# Altium footprint library TSC Footprints.PcbLib: 99 footprints (part 2 of 7)
Each footprint in its own frame and in the unit in brackets; x right, y up, seen from the top. Pads: shape width x height; smd on the part's side, far side on the other; paste and mask are expansions set on the pad; w line width, h text height; cw(c..) or ccw(c..) is an arc to the next point about the centre after c.
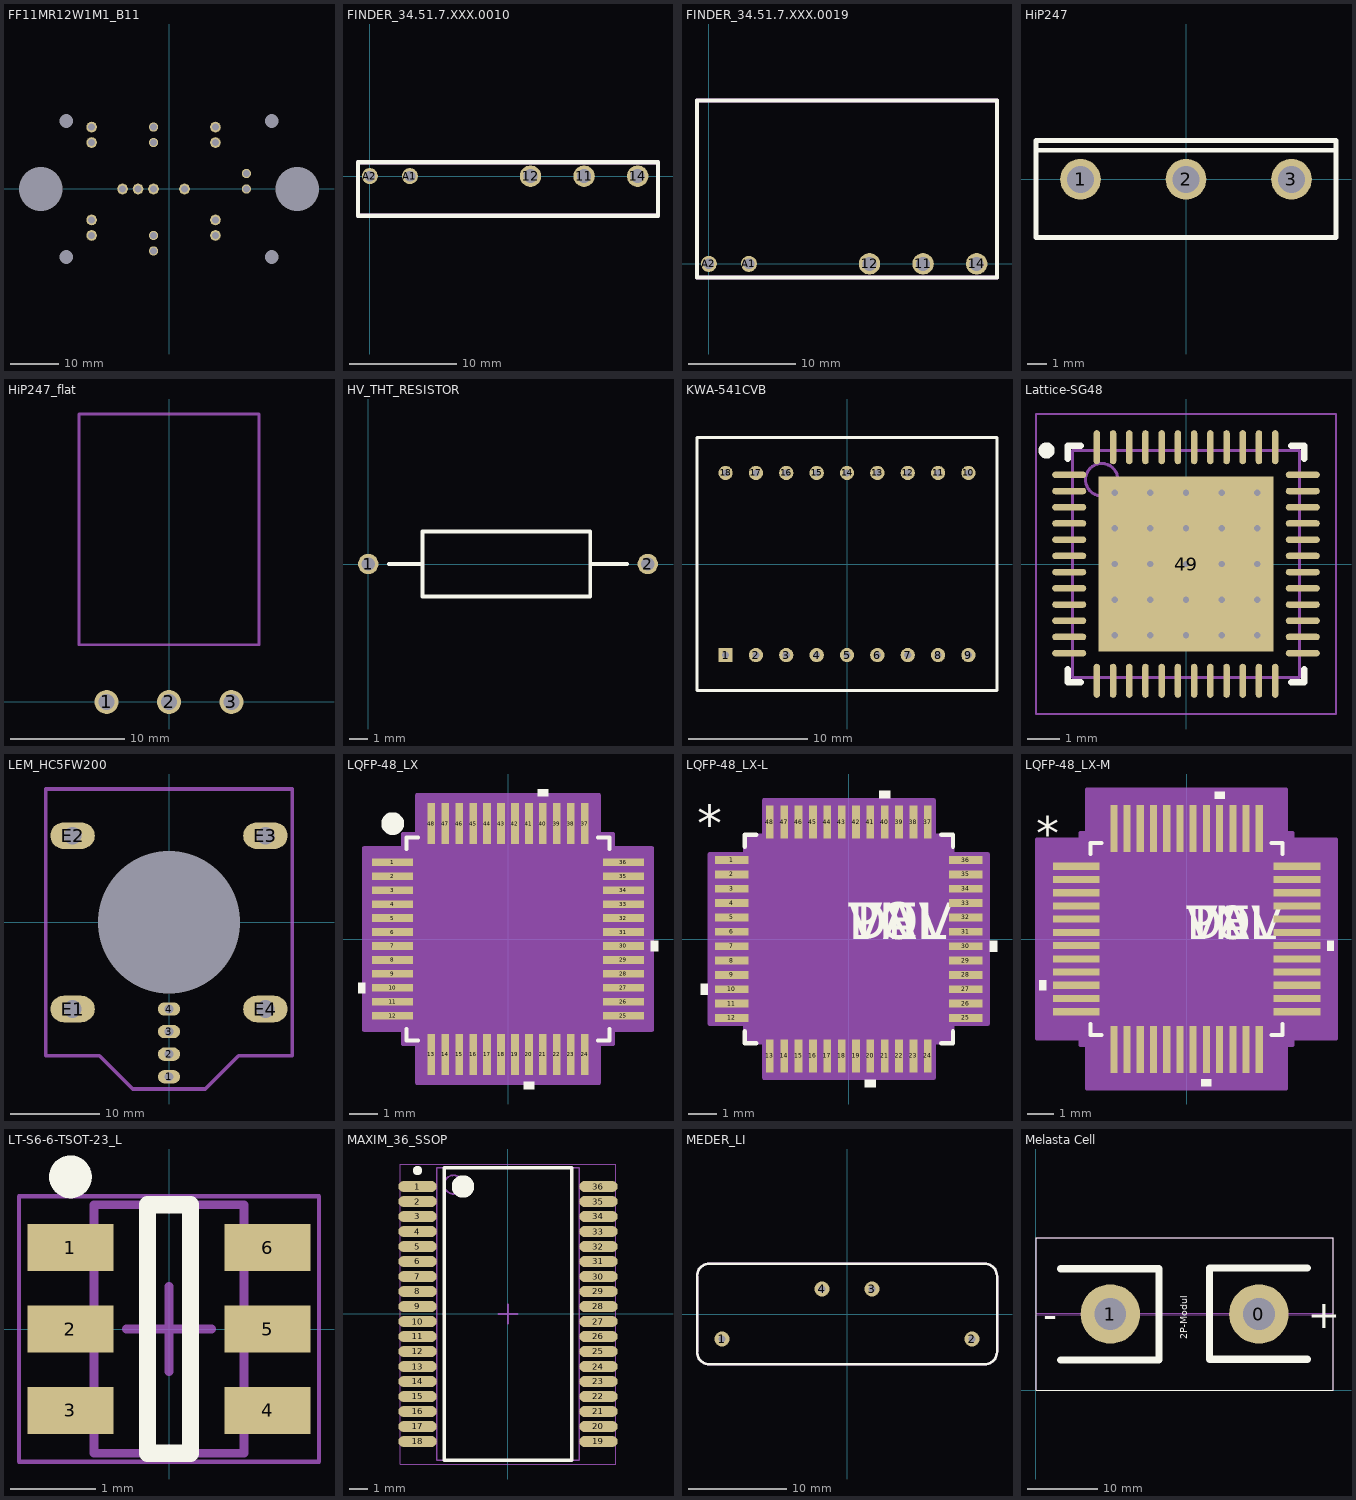
[diagram p1: the footprints below, top view; thin cyan lines are the x and y axes]

## FF11MR12W1M1_B11 [mm] "Infineon EasyDUAL package for FF11MR12W1M1_B11"
height 12
pads (24):
  round 2.2 hole 1.5 unplated: DC+(-16,-9.6) DC+(-16,-6.4) DC+(9.6,-9.6) DC+(9.6,-6.4) DC-(-9.6,0) DC-(-6.4,0) DC-(-3.2,0) DC-(3.2,0) PHASE(-16,9.6) PHASE(-16,12.8) PHASE(9.6,9.6) PHASE(9.6,12.8)
  round 1.9 hole 1.5 unplated: G_HS(-3.2,-9.6) G_LS(-3.2,9.6) NTC_1(16,3.2) NTC_2(16,0) S_HS(-3.2,-12.8) S_LS(-3.2,12.8)
  round 0 hole 9 unplated: ""(-26.5,0) ""(26.5,0)
  round 0 hole 2.8 unplated: ""(-21.25,-14.05) ""(-21.25,14.05) ""(21.25,-14.05) ""(21.25,14.05)
3D body "EasyDUAL.stp": height 12, standoff 0, extent -30.777,-16.9 30.777,16.9

## FINDER_34.51.7.XXX.0010 [mm]
height 5
pads (5):
  round 2 hole 1.3: 11(20,0) 12(15,0) 14(25,0)
  round 1.5 hole 1: A1(3.75,0) A2(0,0)
Top Overlay:
  lines w0.4: -1.1,-3.7 26.9,-3.7 26.9,1.3 -1.1,1.3 -1.1,-3.7
Mechanical 1:
  lines w0.4: -1.1,-3.7 -1.1,1.3 26.9,1.3 26.9,-3.7 -1.1,-3.7
3D body "3451.stp": height 15.01, standoff -3.49, extent -1.144,-3.81 26.856,1.19

## FINDER_34.51.7.XXX.0019 [mm]
height 5
pads (5):
  round 2 hole 1.3: 11(20,0) 12(15,0) 14(25,0)
  round 1.5 hole 1: A1(3.75,0) A2(0,0)
Top Overlay:
  lines w0.4: -1.1,-1.27 26.9,-1.27 26.9,15.24 -1.1,15.24 -1.1,-1.27
Mechanical 1:
  lines w0.4: -1.1,-1.27 -1.1,15.24 26.9,15.24 26.9,-1.27 -1.1,-1.27
3D body "3451x019.stp": height 5, standoff -2.5, extent -1.1,-0.2 26.9,15.4

## HiP247 [mm]
height 25
pads (3):
  round 2.1 hole 1.4: 1(-5.45,0) 2(0,0) 3(5.45,0)
Top Overlay:
  lines w0.254: -7.75,1.5 7.75,1.5 ; 7.75,-3 -7.75,-3 -7.75,2 7.75,2 7.75,-2.921
3D body "TO-247.STEP": height 24.2, standoff -14.8, extent -7.75,-3 7.75,2

## HiP247_flat [mm]
height 5.15
pads (3):
  round 2.1 hole 1.4: 1(-5.45,0) 2(0,0) 3(5.45,0)
Mechanical 1:
  lines w0.254: -7.875,5 7.875,5 7.875,25.15 -7.875,25.15 -7.875,5
3D body "TO-247H.STEP": height 5.4, standoff -7.5, extent -7.75,-0.25 7.75,25.15

## HV_THT_RESISTOR [mm]
height 3
pads (2):
  round 1.1 hole 0.7: 1(0,0) 2(15,0)
Top Overlay:
  lines w0.2: 1.1,0 2.912,0 2.912,1.75 11.913,1.75 11.913,-1.75 2.912,-1.75 2.912,0.025 ; 11.946,0 13.9,0
3D body: height 3.5, standoff 0, extent 2.946,-1.75 11.946,1.75

## KWA-541CVB [mm] "common cathode dual digit alphanumeric display"
height 7.7
pads (18):
  rect 1.2x1.2 hole 0.6: 1(-10.16,-7.62)
  round 1.2 hole 0.6: 2(-7.62,-7.62) 3(-5.08,-7.62) 4(-2.54,-7.62) 5(0,-7.62) 6(2.54,-7.62) 7(5.08,-7.62) 8(7.62,-7.62) 9(10.16,-7.62) 10(10.16,7.62) 11(7.62,7.62) 12(5.08,7.62) 13(2.54,7.62) 14(0,7.62) 15(-2.54,7.62) 16(-5.08,7.62) 17(-7.62,7.62) 18(-10.16,7.62)
Top Overlay:
  lines w0.254: -12.55,-10.575 12.55,-10.575 12.55,10.575 -12.55,10.575 -12.55,-10.575
3D body: height 7.7, standoff 0, extent -12.677,-10.702 12.677,10.702

## Lattice-SG48 [mm] "QFN, 48-Leads, Body 7,00x7,00mm, Pitch 0,50mm, Thermal Pad 4,40x4,40mm, IPC Low Density"
height 1
pads (49):
  oval 1.05x0.2 smd: 1(-3.6,2.75) 2(-3.6,2.25) 3(-3.6,1.75) 4(-3.6,1.25) 5(-3.6,0.75) 6(-3.6,0.25) 7(-3.6,-0.25) 8(-3.6,-0.75) 9(-3.6,-1.25) 10(-3.6,-1.75) 11(-3.6,-2.25) 12(-3.6,-2.75) 25(3.6,-2.75) 26(3.6,-2.25) 27(3.6,-1.75) 28(3.6,-1.25) 29(3.6,-0.75) 30(3.6,-0.25) 31(3.6,0.25) 32(3.6,0.75) 33(3.6,1.25) 34(3.6,1.75) 35(3.6,2.25) 36(3.6,2.75)
  oval 0.2x1.05 smd: 13(-2.75,-3.6) 14(-2.25,-3.6) 15(-1.75,-3.6) 16(-1.25,-3.6) 17(-0.75,-3.6) 18(-0.25,-3.6) 19(0.25,-3.6) 20(0.75,-3.6) 21(1.25,-3.6) 22(1.75,-3.6) 23(2.25,-3.6) 24(2.75,-3.6) 37(2.75,3.6) 38(2.25,3.6) 39(1.75,3.6) 40(1.25,3.6) 41(0.75,3.6) 42(0.25,3.6) 43(-0.25,3.6) 44(-0.75,3.6) 45(-1.25,3.6) 46(-1.75,3.6) 47(-2.25,3.6) 48(-2.75,3.6)
  rect 5.4x5.4 smd: 49(0,0)
via -2.2,2.2 diameter 0.5 hole 0.2
via -1.1,2.2 diameter 0.5 hole 0.2
via 0,2.2 diameter 0.5 hole 0.2
via 1.1,2.2 diameter 0.5 hole 0.2
via 2.2,2.2 diameter 0.5 hole 0.2
via -2.2,1.1 diameter 0.5 hole 0.2
via -1.1,1.1 diameter 0.5 hole 0.2
via 0,1.1 diameter 0.5 hole 0.2
via 1.1,1.1 diameter 0.5 hole 0.2
via 2.2,1.1 diameter 0.5 hole 0.2
via -2.2,0 diameter 0.5 hole 0.2
via -1.1,0 diameter 0.5 hole 0.2
via 0,0 diameter 0.5 hole 0.2
via 1.1,0 diameter 0.5 hole 0.2
via 2.2,0 diameter 0.5 hole 0.2
via -2.2,-1.1 diameter 0.5 hole 0.2
via -1.1,-1.1 diameter 0.5 hole 0.2
via 0,-1.1 diameter 0.5 hole 0.2
via 1.1,-1.1 diameter 0.5 hole 0.2
via 2.2,-1.1 diameter 0.5 hole 0.2
via -2.2,-2.2 diameter 0.5 hole 0.2
via -1.1,-2.2 diameter 0.5 hole 0.2
via 0,-2.2 diameter 0.5 hole 0.2
via 1.1,-2.2 diameter 0.5 hole 0.2
via 2.2,-2.2 diameter 0.5 hole 0.2
Top Overlay:
  circle w0.25: c-4.3,3.5 r0.125
  lines w0.2: -3.65,-3.25 -3.65,-3.65 -3.25,-3.65 ; -3.65,3.25 -3.65,3.65 -3.25,3.65 ; 3.25,-3.65 3.65,-3.65 3.65,-3.25 ; 3.25,3.65 3.65,3.65 3.65,3.25
Mechanical 13:
  circle w0.1: c-2.6,2.6 r0.5
  lines w0.1: -3.5,-3.5 -3.5,3.5 3.5,3.5 3.5,-3.5 -3.5,-3.5
Mechanical 15:
  lines w0.05: -4.625,-4.625 -4.625,4.625 4.625,4.625 4.625,-4.625 -4.625,-4.625
  lines w0.1: -0.5,0 0.5,0 ; 0,-0.5 0,0.5
3D body "Lattice-SG48.step": height 1, standoff 0, extent -3.501,-3.501 3.501,3.501

## LEM_HC5FW200 [mm]
height 12
pads (9):
  oval 2.5x1.5 hole 1: 1(0,-17.37) 2(0,-14.83) 3(0,-12.29) 4(0,-9.75)
  oval 5x3 hole 2: E1(-10.85,-9.75) E2(-10.85,9.75) E3(10.85,9.75) E4(10.85,-9.75)
  round 0 hole 16 unplated: ""(0,0)
Mechanical 1:
  lines w0.4: -13.85,-15 -13.85,15 13.85,15 13.85,-15 7.825,-15 4.075,-18.75 -4.075,-18.75 -7.825,-15 -13.85,-15
3D body: height 12, standoff 0, extent -13.85,-18.75 13.85,15

## LQFP-48_LX [mm]
pads (48):
  rect 1.461x0.27 smd: 1(-4.125,2.75) 2(-4.125,2.25) 3(-4.125,1.75) 4(-4.125,1.25) 5(-4.125,0.75) 6(-4.125,0.25) 7(-4.125,-0.25) 8(-4.125,-0.75) 9(-4.125,-1.25) 10(-4.125,-1.75) 11(-4.125,-2.25) 12(-4.125,-2.75) 25(4.125,-2.75) 26(4.125,-2.25) 27(4.125,-1.75) 28(4.125,-1.25) 29(4.125,-0.75) 30(4.125,-0.25) 31(4.125,0.25) 32(4.125,0.75) 33(4.125,1.25) 34(4.125,1.75) 35(4.125,2.25) 36(4.125,2.75)
  rect 0.27x1.461 smd: 13(-2.75,-4.125) 14(-2.25,-4.125) 15(-1.75,-4.125) 16(-1.25,-4.125) 17(-0.75,-4.125) 18(-0.25,-4.125) 19(0.25,-4.125) 20(0.75,-4.125) 21(1.25,-4.125) 22(1.75,-4.125) 23(2.25,-4.125) 24(2.75,-4.125) 37(2.75,4.125) 38(2.25,4.125) 39(1.75,4.125) 40(1.25,4.125) 41(0.75,4.125) 42(0.25,4.125) 43(-0.25,4.125) 44(-0.75,4.125) 45(-1.25,4.125) 46(-1.75,4.125) 47(-2.25,4.125) 48(-2.75,4.125)
Top Overlay:
  circle w0.5: c-4.125,4.125 r0.157
  region: -5.11,-1.559 -5.364,-1.559 -5.364,-1.94 -5.11,-1.94
  region: 0.941,-5.11 0.56,-5.11 0.56,-5.364 0.941,-5.364
  region: 5.11,-0.059 5.364,-0.059 5.364,-0.44 5.11,-0.44
  region: 1.441,5.11 1.06,5.11 1.06,5.364 1.441,5.364
  lines w0.152: -3.627,-3.218 -3.627,-3.627 -3.218,-3.627 ; -3.627,3.218 -3.627,3.627 -3.218,3.627 ; 3.218,-3.627 3.627,-3.627 3.627,-3.218 ; 3.218,3.627 3.627,3.627 3.627,3.218
Mechanical 13:
  text "*" at -3.119,3 h1.27
Mechanical 15:
  region: -3.258,-3.754 -3.754,-3.754 -3.754,-3.258 -5.143,-3.258 -5.143,3.258 -3.754,3.258 -3.754,3.754 -3.258,3.754 -3.258,5.143 3.258,5.143 3.258,3.754 3.754,3.754 3.754,3.258 5.143,3.258 5.143,-3.258 3.754,-3.258 3.754,-3.754 3.258,-3.754 3.258,-5.143 -3.258,-5.143
  lines w0.152: -5.143,-3.258 -3.754,-3.258 -3.754,-3.754 -3.258,-3.754 -3.258,-5.143 3.258,-5.143 3.258,-3.754 3.754,-3.754 3.754,-3.258 5.143,-3.258 5.143,3.258 3.754,3.258 3.754,3.754 3.258,3.754 3.258,5.143 -3.258,5.143 -3.258,3.754 -3.754,3.754 -3.754,3.258 -5.143,3.258 -5.143,-3.258
3D body: height 0.25, standoff 0, extent 0,0 0.254,0.254
3D body "LQFP-48_LX.step": height 1.6, standoff 0, extent -4.5,-4.5 4.5,4.5

## LQFP-48_LX-L [mm]
pads (48):
  rect 1.156x0.27 smd: 1(-4.074,2.75) 2(-4.074,2.25) 3(-4.074,1.75) 4(-4.074,1.25) 5(-4.074,0.75) 6(-4.074,0.25) 7(-4.074,-0.25) 8(-4.074,-0.75) 9(-4.074,-1.25) 10(-4.074,-1.75) 11(-4.074,-2.25) 12(-4.074,-2.75) 25(4.074,-2.75) 26(4.074,-2.25) 27(4.074,-1.75) 28(4.074,-1.25) 29(4.074,-0.75) 30(4.074,-0.25) 31(4.074,0.25) 32(4.074,0.75) 33(4.074,1.25) 34(4.074,1.75) 35(4.074,2.25) 36(4.074,2.75)
  rect 0.27x1.156 smd: 13(-2.75,-4.074) 14(-2.25,-4.074) 15(-1.75,-4.074) 16(-1.25,-4.074) 17(-0.75,-4.074) 18(-0.25,-4.074) 19(0.25,-4.074) 20(0.75,-4.074) 21(1.25,-4.074) 22(1.75,-4.074) 23(2.25,-4.074) 24(2.75,-4.074) 37(2.75,4.074) 38(2.25,4.074) 39(1.75,4.074) 40(1.25,4.074) 41(0.75,4.074) 42(0.25,4.074) 43(-0.25,4.074) 44(-0.75,4.074) 45(-1.25,4.074) 46(-1.75,4.074) 47(-2.25,4.074) 48(-2.75,4.074)
Top Overlay:
  region: -4.906,-1.559 -5.16,-1.559 -5.16,-1.94 -4.906,-1.94
  region: 0.941,-4.906 0.56,-4.906 0.56,-5.16 0.941,-5.16
  region: 4.906,-0.059 5.16,-0.059 5.16,-0.44 4.906,-0.44
  region: 1.441,4.906 1.06,4.906 1.06,5.16 1.441,5.16
  lines w0.152: -3.627,-3.218 -3.627,-3.627 -3.218,-3.627 ; -3.627,3.218 -3.627,3.627 -3.218,3.627 ; 3.218,-3.627 3.627,-3.627 3.627,-3.218 ; 3.218,3.627 3.627,3.627 3.627,3.218
  text "*" at -5.287,3.381 h1.27
  text "PN" at 0,0 h1.27
  text "DEV" at 0,0 h1.27
  text "VAL" at 0,0 h1.27
  text "TOL" at 0,0 h1.27
Mechanical 13:
  text "*" at -3.119,3 h1.27
  text "RefDes2" at 0,0 h1.27
Mechanical 15:
  region: -2.953,-3.602 -3.602,-3.602 -3.602,-2.953 -4.838,-2.953 -4.838,2.953 -3.602,2.953 -3.602,3.602 -2.953,3.602 -2.953,4.838 2.953,4.838 2.953,3.602 3.602,3.602 3.602,2.953 4.838,2.953 4.838,-2.953 3.602,-2.953 3.602,-3.602 2.953,-3.602 2.953,-4.838 -2.953,-4.838
  lines w0.152: -4.838,-2.953 -3.602,-2.953 -3.602,-3.602 -2.953,-3.602 -2.953,-4.838 2.953,-4.838 2.953,-3.602 3.602,-3.602 3.602,-2.953 4.838,-2.953 4.838,2.953 3.602,2.953 3.602,3.602 2.953,3.602 2.953,4.838 -2.953,4.838 -2.953,3.602 -3.602,3.602 -3.602,2.953 -4.838,2.953 -4.838,-2.953
3D body: height 0.25, standoff 0, extent 0,0 0.254,0.254
3D body "LQFP-48_LX-L.step": height 1.6, standoff 0, extent -4.5,-4.5 4.5,4.5

## LQFP-48_LX-M [mm]
pads (48):
  rect 1.766x0.27 smd: 1(-4.176,2.75) 2(-4.176,2.25) 3(-4.176,1.75) 4(-4.176,1.25) 5(-4.176,0.75) 6(-4.176,0.25) 7(-4.176,-0.25) 8(-4.176,-0.75) 9(-4.176,-1.25) 10(-4.176,-1.75) 11(-4.176,-2.25) 12(-4.176,-2.75) 25(4.176,-2.75) 26(4.176,-2.25) 27(4.176,-1.75) 28(4.176,-1.25) 29(4.176,-0.75) 30(4.176,-0.25) 31(4.176,0.25) 32(4.176,0.75) 33(4.176,1.25) 34(4.176,1.75) 35(4.176,2.25) 36(4.176,2.75)
  rect 0.27x1.766 smd: 13(-2.75,-4.176) 14(-2.25,-4.176) 15(-1.75,-4.176) 16(-1.25,-4.176) 17(-0.75,-4.176) 18(-0.25,-4.176) 19(0.25,-4.176) 20(0.75,-4.176) 21(1.25,-4.176) 22(1.75,-4.176) 23(2.25,-4.176) 24(2.75,-4.176) 37(2.75,4.176) 38(2.25,4.176) 39(1.75,4.176) 40(1.25,4.176) 41(0.75,4.176) 42(0.25,4.176) 43(-0.25,4.176) 44(-0.75,4.176) 45(-1.25,4.176) 46(-1.75,4.176) 47(-2.25,4.176) 48(-2.75,4.176)
Top Overlay:
  region: 1.441,5.313 1.06,5.313 1.06,5.567 1.441,5.567
  region: 5.313,-0.059 5.567,-0.059 5.567,-0.44 5.313,-0.44
  region: 0.941,-5.313 0.56,-5.313 0.56,-5.567 0.941,-5.567
  region: -5.313,-1.559 -5.567,-1.559 -5.567,-1.94 -5.313,-1.94
  lines w0.152: -3.627,-3.218 -3.627,-3.627 -3.218,-3.627 ; -3.627,3.218 -3.627,3.627 -3.218,3.627 ; 3.218,-3.627 3.627,-3.627 3.627,-3.218 ; 3.218,3.627 3.627,3.627 3.627,3.218
  text "TOL" at 0,0 h1.27
  text "VAL" at 0,0 h1.27
  text "DEV" at 0,0 h1.27
  text "PN" at 0,0 h1.27
  text "*" at -5.694,3.381 h1.27
Mechanical 13:
  text "RefDes2" at 0,0 h1.27
  text "*" at -3.119,3 h1.27
Mechanical 15:
  region: -3.766,-4.008 -4.008,-4.008 -4.008,-3.766 -5.651,-3.766 -5.651,3.766 -4.008,3.766 -4.008,4.008 -3.766,4.008 -3.766,5.651 3.766,5.651 3.766,4.008 4.008,4.008 4.008,3.766 5.651,3.766 5.651,-3.766 4.008,-3.766 4.008,-4.008 3.766,-4.008 3.766,-5.651 -3.766,-5.651
  lines w0.152: -5.651,-3.766 -5.651,3.766 -4.008,3.766 -4.008,4.008 -3.766,4.008 -3.766,5.651 3.766,5.651 3.766,4.008 4.008,4.008 4.008,3.766 5.651,3.766 5.651,-3.766 4.008,-3.766 4.008,-4.008 3.766,-4.008 3.766,-5.651 -3.766,-5.651 -3.766,-4.008 -4.008,-4.008 -4.008,-3.766 -5.651,-3.766
3D body: height 0.25, standoff 0, extent 0,0 0.254,0.254
3D body "LQFP-48_LX-M.step": height 1.6, standoff 0, extent -4.5,-4.5 4.5,4.5

## LT-S6-6-TSOT-23_L [mm] "SOT23, 6-Leads, Body 2.90x1.63mm, Pitch 0.95mm, IPC High Density"
height 1
pads (6):
  rect 1x0.55 smd: 1(-1.15,0.95) 2(-1.15,0) 3(-1.15,-0.95) 4(1.15,-0.95) 5(1.15,0) 6(1.15,0.95)
Top Overlay:
  circle w0.25: c-1.15,1.775 r0.125
  lines w0.2: -0.25,-1.45 0.25,-1.45 0.25,1.45 -0.25,1.45 -0.25,-1.45
Mechanical 13:
  lines w0.1: -0.875,-1.45 -0.875,1.45 0.875,1.45 0.875,-1.45 -0.875,-1.45
Mechanical 15:
  lines w0.05: -1.75,-1.55 -1.75,1.55 1.75,1.55 1.75,-1.55 -1.75,-1.55
  lines w0.1: -0.5,0 0.5,0 ; 0,-0.5 0,0.5
3D body: height 1, standoff 0.01, extent -0.875,-1.45 0.875,1.45

## MAXIM_36_SSOP [mm] "Maxim Integrated A36-2  36 SSOP"
height 2.64
pads (36):
  oval 2.05x0.6 smd: 1(-4.825,6.8) 2(-4.825,6) 3(-4.825,5.2) 4(-4.825,4.4) 5(-4.825,3.6) 6(-4.825,2.8) 7(-4.825,2) 8(-4.825,1.2) 9(-4.825,0.4) 10(-4.825,-0.4) 11(-4.825,-1.2) 12(-4.825,-2) 13(-4.825,-2.8) 14(-4.825,-3.6) 15(-4.825,-4.4) 16(-4.825,-5.2) 17(-4.825,-6) 18(-4.825,-6.8) 19(4.825,-6.8) 20(4.825,-6) 21(4.825,-5.2) 22(4.825,-4.4) 23(4.825,-3.6) 24(4.825,-2.8) 25(4.825,-2) 26(4.825,-1.2) 27(4.825,-0.4) 28(4.825,0.4) 29(4.825,1.2) 30(4.825,2) 31(4.825,2.8) 32(4.825,3.6) 33(4.825,4.4) 34(4.825,5.2) 35(4.825,6) 36(4.825,6.8)
Top Overlay:
  circle w0.6: c-2.4,6.8 r0.3
  circle w0.25: c-4.825,7.65 r0.125
  lines w0.2: -3.4,-7.8 3.4,-7.8 3.4,7.8 -3.4,7.8 -3.4,-7.8
Assembly Top:
  circle w0.1: c-2.9,6.9 r0.5
  lines w0.1: -3.8,-7.8 3.8,-7.8 3.8,7.8 -3.8,7.8 -3.8,-7.8
Courtyard Top:
  lines w0.05: -5.75,-8 5.75,-8 5.75,8 -5.75,8 -5.75,-8
  lines w0.1: -0.5,0 0.5,0 ; 0,-0.5 0,0.5
3D body "MAXIM_36_SSOP.step": height 2.64, standoff 0, extent -5.152,-7.8 5.152,7.8

## MEDER_LI [mil] "LI Reed Relay"
height 409.45
pads (4):
  round 60 hole 29.53: 1(-500,-100) 2(500,-100) 3(100,100) 4(-100,100)
Top Overlay:
  lines w10: -600,-151.57 ccw(c-550,-151.57) -550,-201.57 550,-201.57 ccw(c550,-151.57) 600,-151.57 600,151.57 ccw(c550,151.57) 550,201.57 -550,201.57 ccw(c-550,151.57) -600,151.57 -600,-151.57
Mechanical 1:
  lines w10: -600,-151.57 ccw(c-550,-151.57) -550,-201.57 550,-201.57 ccw(c550,-151.57) 600,-151.57 600,151.57 ccw(c550,151.57) 550,201.57 -550,201.57 ccw(c-550,151.57) -600,151.57 -600,-151.57
3D body: height 409.45, standoff 0, extent -600,-201.57 600,201.57

## Melasta Cell [mm] "Melasta SLPBXX-Cell for TSC-5E"
pads (2):
  round 8.4 / inner rect 0x0 / far side rect 12x8.4 hole 4.5: 0(31.5,10.8) 1(10.5,10.8)
Top Overlay:
  lines w0.1: 0,0 0,21.6 42,21.6 42,0 0,0
  lines w1: 3.5,4.3 17.4,4.3 17.4,17.2 3.5,17.2 ; 38.4,4.4 24.5,4.4 24.5,17.3 38.4,17.3
  text "+" at 38.4,8.8 h4
  text "-" at 1,8.8 h4
  text "2P-Modul" at 21.4,7.2 h1
Mechanical 15:
  lines w0.1: 0,0 0,10.7 42,10.7 42,0 0,0 ; 0,10.9 42,10.9 42,21.6 0,21.6 0,10.9